# Altium footprint library My Footprint.PcbLib: 268 footprints (part 14 of 17)
Each footprint in its own frame and in the unit in brackets; x right, y up, seen from the top. Pads: shape width x height; smd on the part's side, far side on the other; paste and mask are expansions set on the pad; w line width, h text height; cw(c..) or ccw(c..) is an arc to the next point about the centre after c.
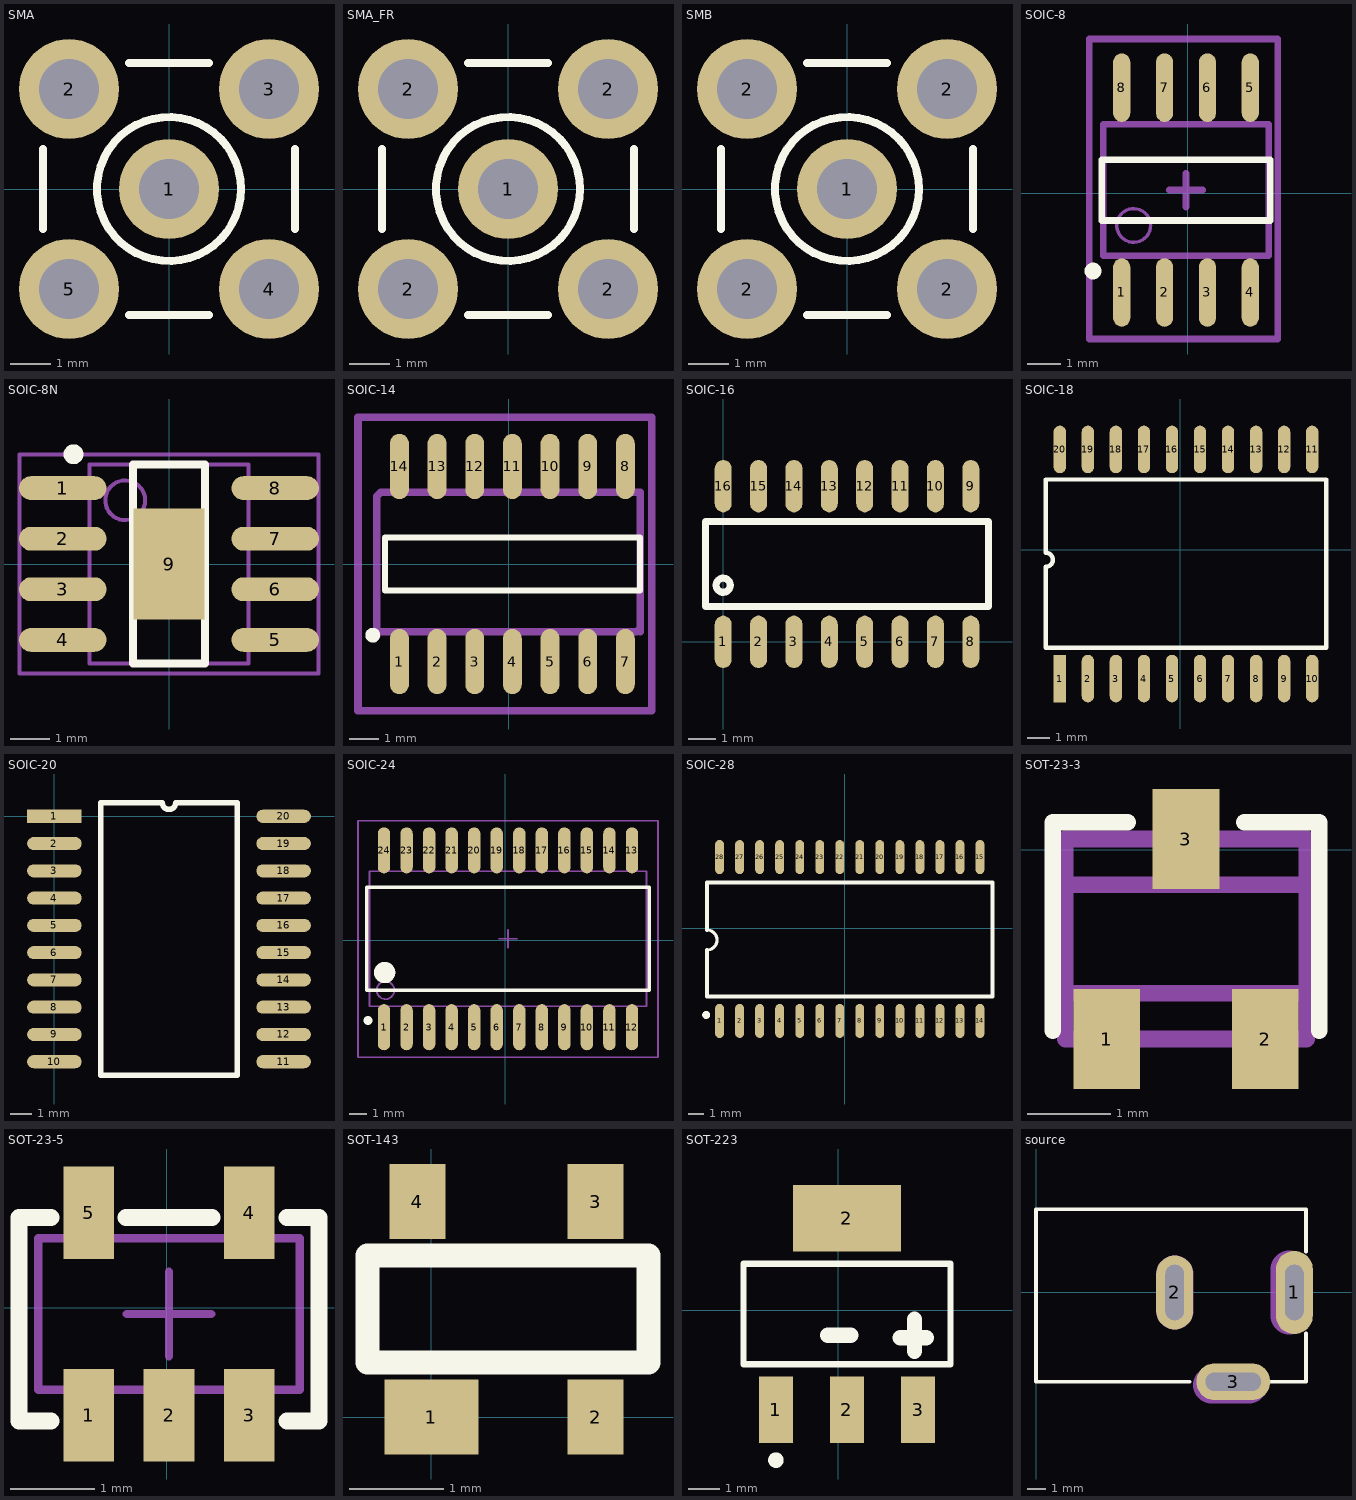
[diagram p13: the footprints below, top view; thin cyan lines are the x and y axes]

## SMA [mm]
height 8
pads (5):
  round 2.5 hole 1.5: 1(0,0) 2(-2.5,2.5) 3(2.5,2.5) 4(2.5,-2.5) 5(-2.5,-2.5)
Top Overlay:
  circle w0.2: c0,0 r1.8
  lines w0.2: -3.15,-1 -3.15,1 ; -1,-3.15 1,-3.15 ; -1,3.15 1,3.15 ; 3.15,-1 3.15,1
Mechanical 1:
  circle w0.025: c0,0 r0.2
  circle w0.025: c0,0 r1.05
  circle w0.025: c0,0 r1.8

## SMA_FR [mm]
height 8
pads (5):
  round 2.5 hole 1.5: 1(0,0) 2(-2.5,-2.5) 2(-2.5,2.5) 2(2.5,-2.5) 2(2.5,2.5)
Top Overlay:
  circle w0.2: c0,0 r1.8
  lines w0.2: -3.15,-1 -3.15,1 ; -1,-3.15 1,-3.15 ; -1,3.15 1,3.15 ; 3.15,-1 3.15,1
Mechanical 1:
  circle w0.025: c0,0 r0.2
  circle w0.025: c0,0 r1.05
  circle w0.025: c0,0 r1.8
3D body "Samtec-SMA-J-P-H-RA-TH1.STEP": height 10.26, standoff -3.84, extent -3.5,-3.5 3.5,11.6

## SMB [mm]
pads (5):
  round 2.5 hole 1.5: 1(0,0) 2(-2.5,-2.5) 2(-2.5,2.5) 2(2.5,-2.5) 2(2.5,2.5)
Top Overlay:
  circle w0.2: c0,0 r1.8
  lines w0.2: -3.15,-1 -3.15,1 ; -1,-3.15 1,-3.15 ; -1,3.15 1,3.15 ; 3.15,-1 3.15,1
Mechanical 1:
  circle w0.025: c0,0 r0.2
  circle w0.025: c0,0 r1.05
  circle w0.025: c0,0 r1.8

## SOIC-8 [mil]
pads (8):
  oval 20x80 smd: 1(-77.09,-115.71) 2(-27.09,-115.71) 3(22.91,-115.71) 4(72.91,-115.71) 5(72.91,123.27) 6(22.91,123.27) 7(-27.09,123.27) 8(-77.09,123.27)
Top Overlay:
  circle w9.84: c-110.55,-90.71 r4.92
  lines w7.87: -100.51,-31.65 -100.51,39.21 96.34,39.21 96.34,-31.65 -100.51,-31.65
Mechanical 13:
  circle w3.94: c-63.11,-37.56 r19.68
  lines w7.87: -98.54,-72.99 -98.54,80.55 94.37,80.55 94.37,-72.99 -98.54,-72.99
Mechanical 15:
  lines w7.87: -21.77,3.78 17.6,3.78 ; -2.09,-15.91 -2.09,23.46 ; -115,-170 -115,180 105,180 105,-170 -115,-170
3D body "SO-8.STEP": height 66.93, standoff 0, extent -96.46,-113.1 96.46,123.12

## SOIC-8N [mm] "SOIC, has a pad under it"
height 1.75
pads (9):
  oval 2.2x0.6 smd: 1(-2.667,1.905) 2(-2.667,0.635) 3(-2.667,-0.635) 4(-2.667,-1.905) 5(2.667,-1.905) 6(2.667,-0.635) 7(2.667,0.635) 8(2.667,1.905)
  rect 1.778x2.794 smd: 9(0,0)
Top Overlay:
  circle w0.25: c-2.4,2.755 r0.125
  lines w0.2: -0.9,-2.5 0.9,-2.5 0.9,2.5 -0.9,2.5 -0.9,-2.5
Mechanical 13:
  circle w0.1: c-1.1,1.6 r0.5
  lines w0.1: -2,-2.5 2,-2.5 2,2.5 -2,2.5 -2,-2.5
Mechanical 15:
  lines w0.1: -0.5,0 0.5,0 ; 0,-0.5 0,0.5 ; -3.75,-2.75 3.75,-2.75 3.75,2.75 -3.75,2.75 -3.75,-2.75
3D body "SO-8.STEP": height 1.7, standoff 0, extent -3,-2.45 3,2.45

## SOIC-14 [mil]
pads (14):
  oval 25x86.61 smd: 1(-145,-129.49) 2(-95,-129.49) 3(-45,-129.49) 4(5,-129.49) 5(55,-129.49) 6(105,-129.49) 7(155,-129.49) 8(155,129.49) 9(105,129.49) 10(55,129.49) 11(5,129.49) 12(-45,129.49) 13(-95,129.49) 14(-145,129.49)
Top Overlay:
  circle w9.84: c-180.43,-94.49 r4.92
  lines w7.87: -164.29,-35.43 -164.29,35.43 174.29,35.43 174.29,-35.43 -164.29,-35.43
Mechanical 13:
  lines w10: -175,-95 -175,90 -170,95 175,95 175,-90 ; -175,-90 170,-90 175,-85
Mechanical 15:
  lines w10: -200,-195 190,-195 190,-140 190,195 -200,195 -200,-195
3D body "SOP14.STEP": height 63.39, standoff 0, extent -166.26,-122.04 176.26,122.05

## SOIC-16 [mil]
pads (16):
  oval 24x74 smd: 1(0,0) 2(50,0) 3(100,0) 4(150,0) 5(200,0) 6(250,0) 7(300,0) 8(350,0) 9(350,220) 10(300,220) 11(250,220) 12(200,220) 13(150,220) 14(100,220) 15(50,220) 16(0,220)
Top Overlay:
  circle w10: c0,80 r10
  lines w10: -25,50 -25,170 375,170 375,50 -25,50
3D body "User Library-SOIC16-150.STEP": height 68.9, standoff 0, extent -18.83,-5 367,223.35

## SOIC-18 [mil]
pads (20):
  rect 22x85 smd: 1(-215,-230)
  oval 22x85 smd: 2(-165,-230) 3(-115,-230) 4(-65,-230) 5(-15,-230) 6(35,-230) 7(85,-230) 8(135,-230) 9(185,-230) 10(235,-230) 11(235,178.7) 12(185,178.7) 13(135,178.7) 14(85,178.7) 15(35,178.7) 16(-15,178.7) 17(-65,178.7) 18(-115,178.7) 19(-165,178.7) 20(-215,178.7)
Top Overlay:
  lines w7.87: -240,-175 -240,-30.65 ccw(c-240,-18.15) -240,-5.65 -240,125 260,125 260,-175 -240,-175
3D body: height 106.3, standoff 3.94, extent -240.02,-200.02 260.02,165.02

## SOIC-20 [mil]
height 39.37
pads (20):
  rect 100x24 smd: 1(0,0)
  oval 100x24 smd: 2(0,-50) 3(0,-100) 4(0,-150) 5(0,-200) 6(0,-250) 7(0,-300) 8(0,-350) 9(0,-400) 10(0,-450) 11(420,-450) 12(420,-400) 13(420,-350) 14(420,-300) 15(420,-250) 16(420,-200) 17(420,-150) 18(420,-100) 19(420,-50) 20(420,0)
Top Overlay:
  lines w10: 85,-475 85,25 197.5,25 ccw(c210,25) 222.5,25 335,25 335,-475 85,-475
3D body "User Library-SOIC-20-300.STEP": height 101.38, standoff -0.98, extent 1.34,-480.9 418.66,30.91

## SOIC-24 [mm]
pads (24):
  oval 0.7x2.6 smd: 1(-6.841,-4.906) 2(-5.571,-4.906) 3(-4.301,-4.906) 4(-3.031,-4.906) 5(-1.761,-4.906) 6(-0.491,-4.906) 7(0.779,-4.906) 8(2.049,-4.906) 9(3.319,-4.906) 10(4.589,-4.906) 11(5.859,-4.906) 12(7.129,-4.906) 13(7.129,5.056) 14(5.859,5.056) 15(4.589,5.056) 16(3.319,5.056) 17(2.049,5.056) 18(0.779,5.056) 19(-0.491,5.056) 20(-1.761,5.056) 21(-3.031,5.056) 22(-4.301,5.056) 23(-5.571,5.056) 24(-6.841,5.056)
Top Overlay:
  circle w0.25: c-7.741,-4.525 r0.125
  circle w0.6: c-6.806,-1.825 r0.3
  lines w0.2: -7.806,-2.825 8.094,-2.825 8.094,2.975 -7.806,2.975 -7.806,-2.825
Mechanical 13:
  circle w0.1: c-6.756,-2.825 r0.5
  lines w0.1: -7.656,-3.725 7.944,-3.725 7.944,3.875 -7.656,3.875 -7.656,-3.725
Mechanical 15:
  lines w0.1: -0.356,0.075 0.644,0.075 ; 0.144,-0.425 0.144,0.575 ; -8.306,-6.604 8.594,-6.604 8.594,6.731 -8.306,6.731 -8.306,-6.604
3D body: height 2.7, standoff 0.1, extent -7.656,-3.725 7.944,3.875

## SOIC-28 [mil]
pads (28):
  oval 22x85 smd: 1(-312.05,-230.87) 2(-262.05,-230.87) 3(-212.05,-230.87) 4(-162.05,-230.87) 5(-112.05,-230.87) 6(-62.05,-230.87) 7(-12.05,-230.87) 8(37.95,-230.87) 9(87.95,-230.87) 10(137.95,-230.87) 11(187.95,-230.87) 12(237.95,-230.87) 13(287.95,-230.87) 14(337.95,-230.87) 15(337.95,178.15) 16(287.95,178.15) 17(237.95,178.15) 18(187.95,178.15) 19(137.95,178.15) 20(87.95,178.15) 21(37.95,178.15) 22(-12.05,178.15) 23(-62.05,178.15) 24(-112.05,178.15) 25(-162.05,178.15) 26(-212.05,178.15) 27(-262.05,178.15) 28(-312.05,178.15)
Top Overlay:
  circle w9.84: c-345.51,-215.87 r4.92
  lines w7.87: -343.35,-53.86 ccw(c-343.35,-28.86) -343.35,-3.86
  lines w10: -343.35,-53.86 -343.35,-170 369.25,-170 369.25,115 -343.35,115 -343.35,-3.86
3D body: height 106.3, standoff 3.94, extent -343.37,-197.97 369.27,144.19
3D body: height 106.3, standoff 3.94, extent -343.37,-197.97 369.27,144.19

## SOT-23-3 [mm]
pads (3):
  rect 0.8x1.2 smd: 1(1.257,-2.273) 2(3.157,-2.273) 3(2.207,0.127)
Top Overlay:
  lines w0.2: 0.607,-2.173 0.607,0.327 1.507,0.327 ; 2.907,0.327 3.807,0.327 3.807,-2.173
Mechanical 1:
  lines w0.2: 0.757,-1.723 3.657,-1.723 ; 0.757,-0.423 3.657,-0.423 ; 1.057,-2.273 1.057,-1.723 ; 1.457,-2.273 1.457,-1.723 ; 2.007,-0.423 2.007,0.127 ; 2.407,-0.423 2.407,0.127 ; 2.957,-2.273 2.957,-1.723 ; 3.357,-2.273 3.357,-1.723 ; 0.757,-2.273 0.757,0.127 3.657,0.127 3.657,-2.273 0.757,-2.273
3D body "SOT-23-3.STEP": height -0.46, standoff -1.66, extent 0.709,-2.416 3.609,0.384

## SOT-23-5 [mm]
pads (5):
  rect 0.6x1.1 smd: 1(-0.926,-1.273) 2(0.024,-1.273) 3(0.974,-1.273) 4(0.974,1.127) 5(-0.926,1.127)
Top Overlay:
  lines w0.2: -1.373,-1.343 -1.754,-1.343 -1.754,1.07 -1.373,1.07 ; -0.484,1.07 0.532,1.07 ; 1.421,-1.343 1.802,-1.343 1.802,1.07 1.421,1.07
Mechanical 13:
  lines w0.1: -1.526,-0.973 1.574,-0.973 1.574,0.827 -1.526,0.827 -1.526,-0.973
Mechanical 15:
  lines w0.1: -0.476,-0.073 0.524,-0.073 ; 0.024,-0.573 0.024,0.427
3D body "SOT-23-5.STEP": height 1.2, standoff 0, extent -1.45,-1.527 1.45,1.273

## SOT-143 [mm]
pads (4):
  rect 1x0.8 smd: 1(0,0)
  rect 0.6x0.8 smd: 2(1.75,0) 3(1.75,2.3) 4(-0.15,2.3)
Top Overlay:
  lines w0.254: -0.683,0.583 -0.683,1.726 2.317,1.726 2.317,0.583 -0.683,0.583
3D body "User Library-SOT-143.step": height 1, standoff 0, extent -0.66,-0.06 2.26,2.36

## SOT-223 [mm] "ASM1117系列"
pads (4):
  rect 1.1x2.15 smd: 1(-2.012,-3.227) 2(0.288,-3.227) 3(2.588,-3.227)
  rect 3.5x2.15 smd: 2(0.288,2.973)
Top Overlay:
  circle w0.25: c-2.012,-4.852 r0.125
  lines w0.2: -3.062,-1.752 -3.062,1.498 3.638,1.498 3.638,-1.752 -3.062,-1.752
  lines w0.5: -0.339,-0.81 0.411,-0.81 ; 2.011,-0.89 2.851,-0.89 ; 2.471,-1.33 2.471,-0.29
3D body "SOT-223_MP04A.STEP": height 1.7, standoff 0, extent -2.996,-3.48 3.504,3.48

## source [mm] "DC Power Jack, 2.5mm, KLD Series, PCB Mount"
height 1.75
pads (3):
  oval 2x4.5 hole 1 slot 3 at 90 deg: 1(13.97,0)
  oval 2x4 hole 1 slot 3 at 90 deg: 2(7.5,0)
  oval 4x2 hole 1 slot 3 at 0 deg: 3(10.668,-4.826)
Top Overlay:
  lines w0.2: 8.3,-4.826 0,-4.826 0,4.5 14.6,4.5 14.6,2.2 ; 12.7,-4.826 14.6,-4.826 14.6,-2.2
Mechanical 1:
  lines w1: 7.5,-1 7.5,1 ; 9.5,-5 11.5,-5 ; 13.7,-1.25 13.7,1.25
Mechanical 2:
  lines w2.016: 7.5,-1 7.5,1 ; 9.5,-5 11.5,-5 ; 13.7,-1.25 13.7,1.25
3D body "SW3dPS-rapc722.STEP": height 10.92, standoff -3.56, extent 0,-5.08 14.605,4.445